# Altium footprint library STguitar.PcbLib: 33 footprints (part 2 of 3)
Each footprint in its own frame and in the unit in brackets; x right, y up, seen from the top. Pads: shape width x height; smd on the part's side, far side on the other; paste and mask are expansions set on the pad; w line width, h text height; cw(c..) or ccw(c..) is an arc to the next point about the centre after c.
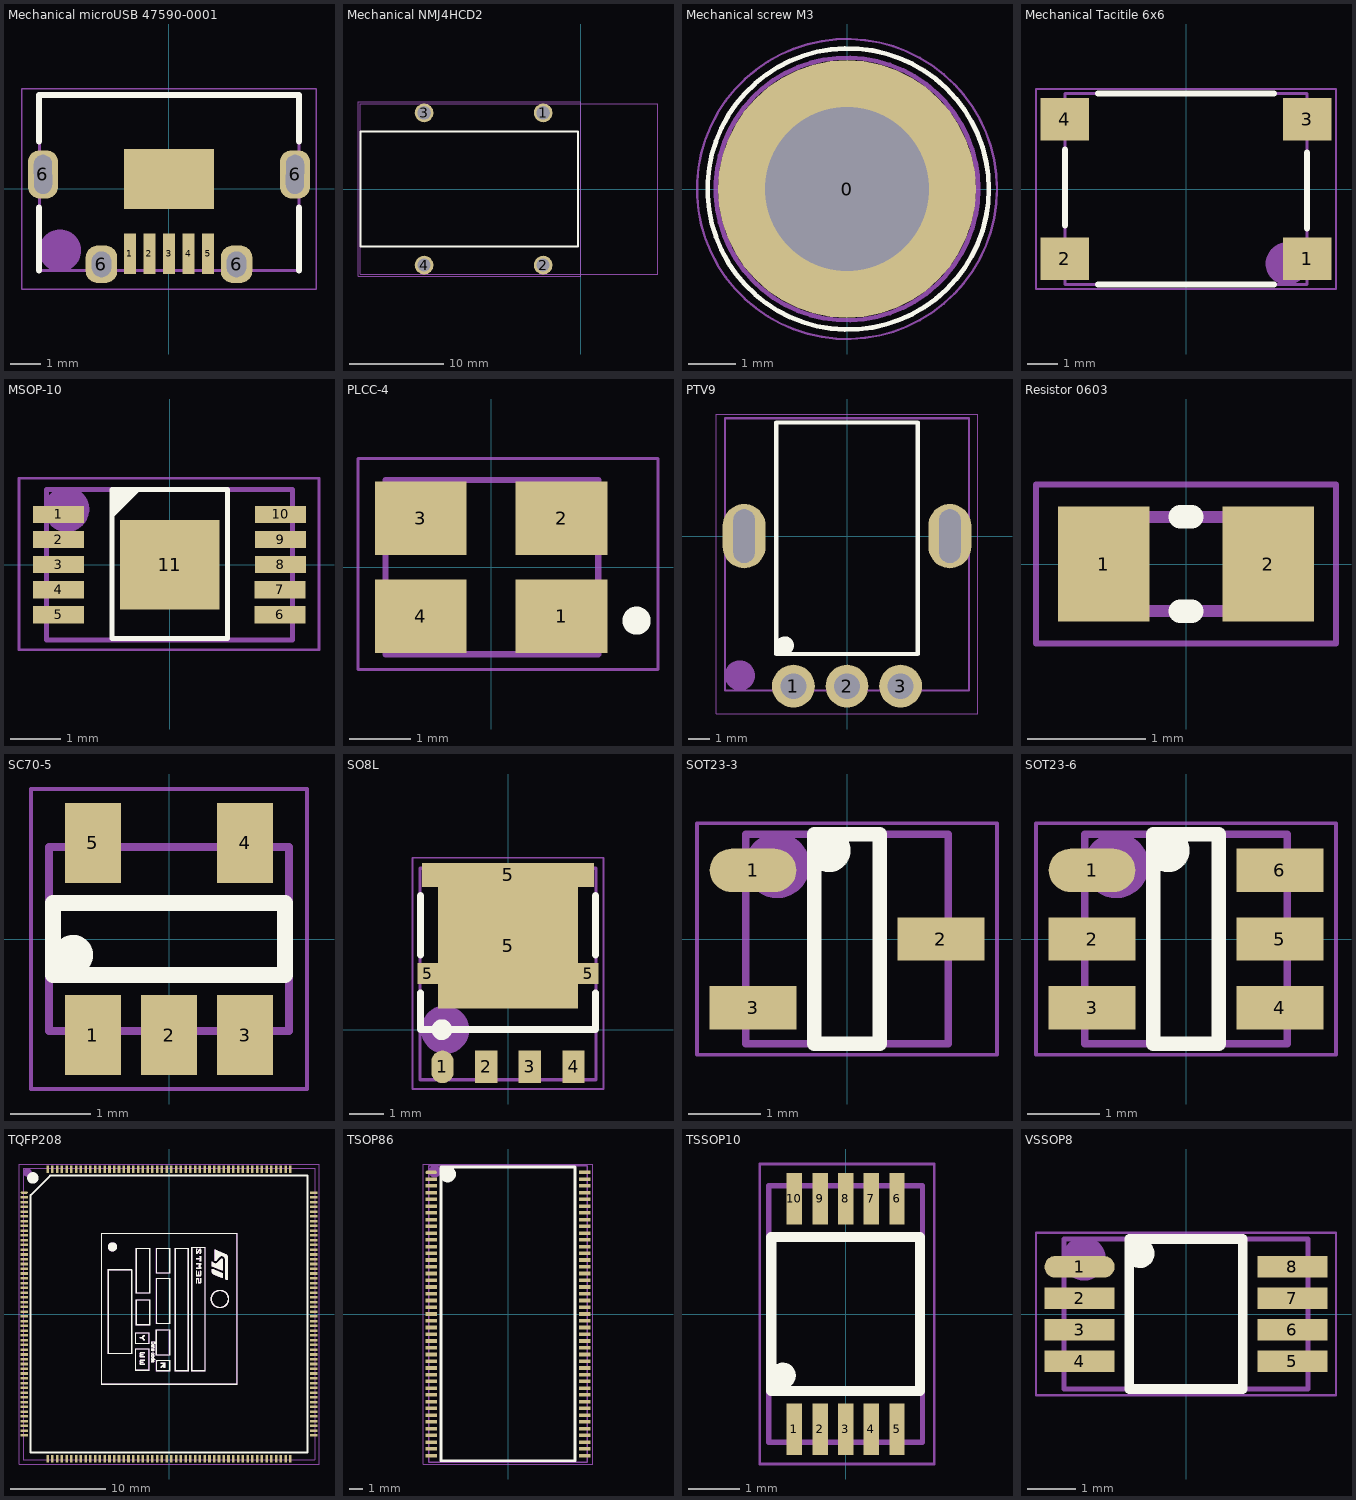
[diagram p1: the footprints below, top view; thin cyan lines are the x and y axes]

## Mechanical microUSB 47590-0001 [mm]
pads (10):
  rect 0.4x1.35 smd: 1(-1.3,-2.166) 2(-0.65,-2.166) 3(0,-2.166) 4(0.65,-2.166) 5(1.3,-2.166)
  rrect75% 1x1.6 hole 1.3 slot 0.6 at 0.33 deg: 6(-4.2,0.484)
  rrect75% 1.05x1.25 hole 0.85 slot 0.65 at 0.33 deg: 6(-2.25,-2.516)
  rrect75% 1.05x1.25 hole 0.85 slot 0.65 at 179.67 deg: 6(2.25,-2.516)
  rrect75% 1x1.6 hole 1.3 slot 0.6 at 179.67 deg: 6(4.2,0.484)
  rect 3x2 smd: ""(0,0.334)
Top Overlay:
  lines w0.2: -4.325,-2.716 -4.325,-0.616 ; -4.325,1.584 -4.325,3.134 -0.925,3.134 4.325,3.134 4.325,1.584 ; 4.325,-2.716 4.325,-0.616
Mechanical 13:
  lines w0.1: -4.325,-2.716 4.325,-2.716 4.325,3.184 -4.325,3.184 -4.325,-2.716
  lines w1: -3.432,-2.057 cw(c-3.632,-2.057) -3.433,-2.036
  text ".Designator" at -3.75,-0.1 h1
Top Component Outline (Mech15):
  lines w0.05: -4.9,-3.341 -4.9,3.334 4.9,3.334 4.9,-3.341 -4.9,-3.341
3D body "475900001.stp": height 2.71, standoff -0.65, extent -4.325,-2.716 4.325,3.184

## Mechanical NMJ4HCD2 [mm]
pads (4):
  round 2 hole 1.4: 1(-4,8.115) 2(-4,-8.115) 3(-16.7,8.115) 4(-16.7,-8.115)
Top Overlay:
  lines w0.2: -23.473,-6.115 -23.473,6.115 -0.3,6.115 -0.3,-6.115 -23.473,-6.115
Mechanical 13:
  lines w0.1: -23.525,-9.1 -23.525,9.1 8.25,9.1 8.25,-9.1 -23.525,-9.1
  text ".Designator" at -22.325,-0.7 h2
Top Component Outline (Mech15):
  lines w0.05: -23.75,-9.325 0,-9.325 0,9.325 -23.75,9.325 -23.75,-9.325
3D body "User Library-Audio Jack Neutrik Amphenol 6_35.STEP": height 17.8, standoff -2.14, extent -23.53,-9.1 8.264,9.1

## Mechanical screw M3 [mm]
pads (1):
  round 5.5 hole 3.5: 0(0,0)
Top Overlay:
  circle w0.1: c0.025,0 r3
Mechanical 13:
  circle w0.1: c0,0 r2.8
  text ".Designator" at 0,0 h0.5
Top Component Outline (Mech15):
  circle w0.05: c0,0 r3.2
3D body "TR Fastenings Ltd-M3X5MM.step": height 3, standoff -5, extent -2.75,-2.75 2.75,2.75

## Mechanical Tacitile 6x6 [mm]
pads (4):
  rect 1.6x1.4 smd: 1(4,-2.3) 2(-4,-2.3) 3(4,2.3) 4(-4,2.3)
Top Overlay:
  lines w0.2: -4,-1.2 -4,1.3 ; -2.9,-3.15 2.9,-3.15 ; -2.9,3.15 2.9,3.15 ; 4,-1.3 4,1.2
Mechanical 13:
  lines w0.1: -4,-3.15 -4,3.15 4,3.15 4,-3.15 -4,-3.15
  lines w1: 3.527,-2.464 cw(c3.327,-2.464) 3.526,-2.443
  text ".Designator" at -3.125,-0.175 h0.8
Top Component Outline (Mech15):
  lines w0.05: -4.95,-3.3 -4.95,3.3 4.95,3.3 4.95,-3.3 -4.95,-3.3
3D body "B3FS_1000.step": height 3, standoff -0.1, extent -4,-3.15 4,3.15

## MSOP-10 [mm]
pads (11):
  rect 1.016x0.343 smd: 1(-2.212,1) 2(-2.212,0.5) 3(-2.212,0) 4(-2.212,-0.5) 5(-2.212,-1) 6(2.2,-1) 7(2.2,-0.5) 8(2.212,0) 9(2.212,0.5) 10(2.212,1)
  rect 1.982x1.782 smd: 11(0,0)
Top Overlay:
  lines w0.1: -1.15,0.975 -0.625,1.5 ; -1.15,1.075 -0.725,1.5 ; -1.125,1.175 -0.8,1.5 -0.775,1.5 ; -1.125,1.3 -0.925,1.5 ; -1.125,1.375 -1,1.5 ; -1.15,-1.475 -1.15,1.5 1.15,1.5 1.15,-1.475 -1.15,-1.475
Mechanical 13:
  lines w0.1: -2.45,-1.5 -2.45,1.5 2.45,1.5 2.45,-1.5 -2.45,-1.5
  lines w0.5: -1.851,1.121 ccw(c-2.05,1.1) -1.85,1.1
  text ".Designator" at -2.275,-0.275 h0.5
Top Component Outline (Mech15):
  lines w0.05: -3,-1.7 2.975,-1.7 2.975,1.725 -3,1.725 -3,-1.7
3D body "User Library-MSOP-10-1.step": height 1.05, standoff 0, extent -2.514,-1.5 2.514,1.5

## PLCC-4 [mm]
pads (4):
  rect 1.5x1.2 smd: 1(1.15,-0.8) 2(1.15,0.8) 3(-1.15,0.8) 4(-1.15,-0.8)
Top Overlay:
  circle w0.254: c2.375,-0.875 r0.103
Mechanical 13:
  lines w0.1: -1.725,-1.425 1.75,-1.425 1.75,1.425 -1.725,1.425 -1.725,-1.425
  lines w0.5: 1.05,-0.9 cw(c1.05,-0.8) 1.06,-0.899
  text ".Designator" at -1.2,-0.45 h1
Top Component Outline (Mech15):
  lines w0.05: -2.175,-1.675 2.725,-1.675 2.725,1.775 -2.175,1.775 -2.175,-1.675
3D body "User Library-HSMx-A2_A3-xx-xxxxx SMD LED PLCC-4.step": height 1.9, standoff 0, extent -1.75,-1.4 1.75,1.4

## PTV9 [mm]
pads (5):
  round 2 hole 1.2: 1(-2.5,-7) 2(0,-7) 3(2.5,-7)
  oval 2x3 hole 2.5 slot 1 at 0 deg: ""(-4.8,0) ""(4.8,0)
Top Overlay:
  circle w0.45: c-2.9,-5.1 r0.2
  lines w0.2: -3.3,-5.5 3.3,-5.5 3.3,5.3 -3.3,5.3 -3.3,-5.5
Mechanical 13:
  lines w0.1: -5.7,-7.2 5.7,-7.2 5.7,5.5 -5.7,5.5 -5.7,-7.2
  lines w1: -4.8,-6.5 cw(c-5,-6.5) -4.801,-6.479
  text ".Designator" at -2.85,-0.025 h1
Top Component Outline (Mech15):
  lines w0.05: -6.1,-8.3 6.1,-8.3 6.1,5.7 -6.1,5.7 -6.1,-8.3
3D body "ptv09a-4x15f-xxxx.stp": height 14.5, standoff -4.49, extent -5.7,-7.15 5.7,5.5

## Resistor 0603 [mm]
pads (2):
  rect 0.78x0.98 smd: 1(-0.7,0) 2(0.7,0)
Top Overlay:
  lines w0.2: -0.05,-0.4 0.05,-0.4 ; -0.05,0.4 0.05,0.4
Mechanical 13:
  lines w0.1: -0.8,-0.4 -0.8,0.4 0.8,0.4 0.8,-0.4 -0.8,-0.4
  text ".Designator" at -0.8,-0.225 h0.5
Top Component Outline (Mech15):
  lines w0.05: -1.275,-0.675 -1.275,0.675 1.275,0.675 1.275,-0.675 -1.275,-0.675
3D body "User Library-SMD RESISTOR-1 (1).step": height 0.43, standoff -0.03, extent -0.85,-0.4 0.75,0.4

## SC70-5 [mm]
pads (5):
  rect 0.7x1 smd: 1(-0.95,-1.2) 2(0,-1.2) 3(0.95,-1.2) 4(0.95,1.2) 5(-0.95,1.2)
Top Overlay:
  circle w0.254: c-1.2,-0.2 r0.125
  lines w0.2: -1.45,-0.45 1.45,-0.45 1.45,0.45 -1.45,0.45 -1.45,-0.45
Mechanical 13:
  lines w0.1: -1.5,-1.15 1.5,-1.15 1.5,1.15 -1.5,1.15 -1.5,-1.15
  text ".Designator" at -0.8,-0.225 h0.5
Top Component Outline (Mech15):
  lines w0.05: -1.725,-1.875 1.725,-1.875 1.725,1.875 -1.725,1.875 -1.725,-1.875
3D body "User Library-sot353.step": height 1, standoff 0, extent -1.05,-1.15 1.05,1.15

## SO8L [mm]
pads (8):
  oval 0.65x0.95 smd: 1(-1.905,-1.081)
  rect 0.65x0.95 smd: 2(-0.635,-1.081) 3(0.635,-1.081) 4(1.905,-1.081)
  rect 0.595x0.61 smd: 5(-2.328,1.634) 5(2.328,1.634)
  rect 4.061x3.63 smd: 5(0,2.435)
  rect 5x0.7 smd: 5(0,4.5)
Top Overlay:
  circle w0.3: c-1.925,0 r0.15
  lines w0.2: -2.55,1.075 -2.55,0 2.55,0 2.55,1.075 ; -2.55,2.175 -2.55,3.9 ; 2.55,2.175 2.55,3.9
Mechanical 13:
  lines w0.1: -2.56,-1.455 2.56,-1.455 2.56,4.695 -2.56,4.695 -2.56,-1.455
  lines w1: -1.629,0 cw(c-1.829,0) -1.63,0.021
  text ".Designator" at 0.3,-1 h0.7
Top Component Outline (Mech15):
  lines w0.05: -2.775,-1.725 2.775,-1.725 2.775,5 -2.775,5 -2.775,-1.725
3D body "User Library-PowerPAK_SO-8L_SINGLE.STEP": height 1.07, standoff 0, extent -2.56,-1.455 2.56,4.695

## SOT23-3 [mm] "SOT23, 3-Leads, Body 2.9x1.3mm, Pitch 0.95mm, Lead Span 2.5mm, IPC High Density"
height 1.1
pads (3):
  oval 1.2x0.6 smd: 1(-1.3,0.95)
  rect 1.2x0.6 smd: 2(1.3,0) 3(-1.3,-0.95)
Top Overlay:
  circle w0.3: c-0.25,1.225 r0.15
  lines w0.2: -0.45,-1.45 0.45,-1.45 0.45,1.45 -0.45,1.45 -0.45,-1.45
Mechanical 13:
  lines w0.1: -1.4,-1.45 1.4,-1.45 1.4,1.45 -1.4,1.45 -1.4,-1.45
  lines w0.5: -0.765,1.016 cw(c-0.965,1.016) -0.766,1.037
  text ".Designator" at -1.075,-0.1 h0.5
Top Component Outline (Mech15):
  lines w0.05: -2.075,-1.6 2.075,-1.6 2.075,1.6 -2.075,1.6 -2.075,-1.6
3D body "CircuitWorks-SOT-23.step": height 1.06, standoff -0.04, extent -1.25,-1.5 1.25,1.5

## SOT23-6 [mm]
pads (6):
  oval 1.2x0.6 smd: 1(-1.3,0.95)
  rect 1.2x0.6 smd: 2(-1.3,0) 3(-1.3,-0.95) 4(1.3,-0.95) 5(1.3,0) 6(1.3,0.95)
Top Overlay:
  circle w0.3: c-0.25,1.225 r0.15
  lines w0.2: -0.45,-1.45 0.45,-1.45 0.45,1.45 -0.45,1.45 -0.45,-1.45
Mechanical 13:
  lines w0.1: -1.4,-1.45 1.4,-1.45 1.4,1.45 -1.4,1.45 -1.4,-1.45
  lines w0.5: -0.765,1.016 cw(c-0.965,1.016) -0.766,1.037
  text ".Designator" at -1.225,-0.175 h0.5
Top Component Outline (Mech15):
  lines w0.05: -2.075,-1.6 2.075,-1.6 2.075,1.6 -2.075,1.6 -2.075,-1.6
3D body "SN74LVC2G14DBVR.stp": height 1.45, standoff 0, extent -1.4,-1.45 1.4,1.45

## TQFP208 [mm]
pads (208):
  oval 0.75x0.27 smd: 1(-15.2,12.75)
  rect 0.75x0.27 smd: 2(-15.2,12.25) 3(-15.2,11.75) 4(-15.2,11.25) 5(-15.2,10.75) 6(-15.2,10.25) 7(-15.2,9.75) 8(-15.2,9.25) 9(-15.2,8.75) 10(-15.2,8.25) 11(-15.2,7.75) 12(-15.2,7.25) 13(-15.2,6.75) 14(-15.2,6.25) 15(-15.2,5.75) 16(-15.2,5.25) 17(-15.2,4.75) 18(-15.2,4.25) 19(-15.2,3.75) 20(-15.2,3.25) 21(-15.2,2.75) 22(-15.2,2.25) 23(-15.2,1.75) 24(-15.2,1.25) 25(-15.2,0.75) 26(-15.2,0.25) 27(-15.2,-0.25) 28(-15.2,-0.75) 29(-15.2,-1.25) 30(-15.2,-1.75) 31(-15.2,-2.25) 32(-15.2,-2.75) 33(-15.2,-3.25) 34(-15.2,-3.75) 35(-15.2,-4.25) 36(-15.2,-4.75) 37(-15.2,-5.25) 38(-15.2,-5.75) 39(-15.2,-6.25) 40(-15.2,-6.75) 41(-15.2,-7.25) 42(-15.2,-7.75) 43(-15.2,-8.25) 44(-15.2,-8.75) 45(-15.2,-9.25) 46(-15.2,-9.75) 47(-15.2,-10.25) 48(-15.2,-10.75) 49(-15.2,-11.25) 50(-15.2,-11.75) 51(-15.2,-12.25) 52(-15.2,-12.75) 105(15.2,-12.75) 106(15.2,-12.25) 107(15.2,-11.75) 108(15.2,-11.25) 109(15.2,-10.75) 110(15.2,-10.25) 111(15.2,-9.75) 112(15.2,-9.25) 113(15.2,-8.75) 114(15.2,-8.25) 115(15.2,-7.75) 116(15.2,-7.25) 117(15.2,-6.75) 118(15.2,-6.25) 119(15.2,-5.75) 120(15.2,-5.25) 121(15.2,-4.75) 122(15.2,-4.25) 123(15.2,-3.75) 124(15.2,-3.25) 125(15.2,-2.75) 126(15.2,-2.25) 127(15.2,-1.75) 128(15.2,-1.25) 129(15.2,-0.75) 130(15.2,-0.25) 131(15.2,0.25) 132(15.2,0.75) 133(15.2,1.25) 134(15.2,1.75) 135(15.2,2.25) 136(15.2,2.75) 137(15.2,3.25) 138(15.2,3.75) 139(15.2,4.25) 140(15.2,4.75) 141(15.2,5.25) 142(15.2,5.75) 143(15.2,6.25) 144(15.2,6.75) 145(15.2,7.25) 146(15.2,7.75) 147(15.2,8.25) 148(15.2,8.75) 149(15.2,9.25) 150(15.2,9.75) 151(15.2,10.25) 152(15.2,10.75) 153(15.2,11.25) 154(15.2,11.75) 155(15.2,12.25) 156(15.2,12.75)
  rect 0.27x0.75 smd: 53(-12.75,-15.2) 54(-12.25,-15.2) 55(-11.75,-15.2) 56(-11.25,-15.2) 57(-10.75,-15.2) 58(-10.25,-15.2) 59(-9.75,-15.2) 60(-9.25,-15.2) 61(-8.75,-15.2) 62(-8.25,-15.2) 63(-7.75,-15.2) 64(-7.25,-15.2) 65(-6.75,-15.2) 66(-6.25,-15.2) 67(-5.75,-15.2) 68(-5.25,-15.2) 69(-4.75,-15.2) 70(-4.25,-15.2) 71(-3.75,-15.2) 72(-3.25,-15.2) 73(-2.75,-15.2) 74(-2.25,-15.2) 75(-1.75,-15.2) 76(-1.25,-15.2) 77(-0.75,-15.2) 78(-0.25,-15.2) 79(0.25,-15.2) 80(0.75,-15.2) 81(1.25,-15.2) 82(1.75,-15.2) 83(2.25,-15.2) 84(2.75,-15.2) 85(3.25,-15.2) 86(3.75,-15.2) 87(4.25,-15.2) 88(4.75,-15.2) 89(5.25,-15.2) 90(5.75,-15.2) 91(6.25,-15.2) 92(6.75,-15.2) 93(7.25,-15.2) 94(7.75,-15.2) 95(8.25,-15.2) 96(8.75,-15.2) 97(9.25,-15.2) 98(9.75,-15.2) 99(10.25,-15.2) 100(10.75,-15.2) 101(11.25,-15.2) 102(11.75,-15.2) 103(12.25,-15.2) 104(12.75,-15.2) 157(12.75,15.2) 158(12.25,15.2) 159(11.75,15.2) 160(11.25,15.2) 161(10.75,15.2) 162(10.25,15.2) 163(9.75,15.2) 164(9.25,15.2) 165(8.75,15.2) 166(8.25,15.2) 167(7.75,15.2) 168(7.25,15.2) 169(6.75,15.2) 170(6.25,15.2) 171(5.75,15.2) 172(5.25,15.2) 173(4.75,15.2) 174(4.25,15.2) 175(3.75,15.2) 176(3.25,15.2) 177(2.75,15.2) 178(2.25,15.2) 179(1.75,15.2) 180(1.25,15.2) 181(0.75,15.2) 182(0.25,15.2) 183(-0.25,15.2) 184(-0.75,15.2) 185(-1.25,15.2) 186(-1.75,15.2) 187(-2.25,15.2) 188(-2.75,15.2) 189(-3.25,15.2) 190(-3.75,15.2) 191(-4.25,15.2) 192(-4.75,15.2) 193(-5.25,15.2) 194(-5.75,15.2) 195(-6.25,15.2) 196(-6.75,15.2) 197(-7.25,15.2) 198(-7.75,15.2) 199(-8.25,15.2) 200(-8.75,15.2) 201(-9.25,15.2) 202(-9.75,15.2) 203(-10.25,15.2) 204(-10.75,15.2) 205(-11.25,15.2) 206(-11.75,15.2) 207(-12.25,15.2) 208(-12.75,15.2)
Top Overlay:
  drawing of 3154 lines, arcs and shapes, not listed
Mechanical 13:
  drawing of 3153 lines, arcs and shapes, not listed
  text ".Designator" at -9.55,9.906 h2
Top Component Outline (Mech15):
  lines w0.05: -15.75,-15.75 15.75,-15.75 15.75,15.75 -15.75,15.75 -15.75,-15.75
3D body "User Library-TQFP-208-1.step": height 3.5, standoff 0, extent -15.293,-15.293 15.293,15.293

## TSOP86 [mm]
pads (86):
  oval 0.835x0.27 smd: 1(-5.7,10.5)
  rect 0.835x0.27 smd: 2(-5.7,10) 3(-5.7,9.5) 4(-5.7,9) 5(-5.7,8.5) 6(-5.7,8) 7(-5.7,7.5) 8(-5.7,7) 9(-5.7,6.5) 10(-5.7,6) 11(-5.7,5.5) 12(-5.7,5) 13(-5.7,4.5) 14(-5.7,4) 15(-5.7,3.5) 16(-5.7,3) 17(-5.7,2.5) 18(-5.7,2) 19(-5.7,1.5) 20(-5.7,1) 21(-5.7,0.5) 22(-5.7,0) 23(-5.7,-0.5) 24(-5.7,-1) 25(-5.7,-1.5) 26(-5.7,-2) 27(-5.7,-2.5) 28(-5.7,-3) 29(-5.7,-3.5) 30(-5.7,-4) 31(-5.7,-4.5) 32(-5.7,-5) 33(-5.7,-5.5) 34(-5.7,-6) 35(-5.7,-6.5) 36(-5.7,-7) 37(-5.7,-7.5) 38(-5.7,-8) 39(-5.7,-8.5) 40(-5.7,-9) 41(-5.7,-9.5) 42(-5.7,-10) 43(-5.7,-10.5) 44(5.7,-10.5) 45(5.7,-10) 46(5.7,-9.5) 47(5.7,-9) 48(5.7,-8.5) 49(5.7,-8) 50(5.7,-7.5) 51(5.7,-7) 52(5.7,-6.5) 53(5.7,-6) 54(5.7,-5.5) 55(5.7,-5) 56(5.7,-4.5) 57(5.7,-4) 58(5.7,-3.5) 59(5.7,-3) 60(5.7,-2.5) 61(5.7,-2) 62(5.7,-1.5) 63(5.7,-1) 64(5.7,-0.5) 65(5.7,0) 66(5.7,0.5) 67(5.7,1) 68(5.7,1.5) 69(5.7,2) 70(5.7,2.5) 71(5.7,3) 72(5.7,3.5) 73(5.7,4) 74(5.7,4.5) 75(5.7,5) 76(5.7,5.5) 77(5.7,6) 78(5.7,6.5) 79(5.7,7) 80(5.7,7.5) 81(5.7,8) 82(5.7,8.5) 83(5.7,9) 84(5.7,9.5) 85(5.7,10) 86(5.7,10.5)
Top Overlay:
  circle w0.6: c-4.468,10.368 r0.3
  lines w0.2: -4.975,-10.875 -4.975,10.9 -0.013,10.9 4.975,10.9 4.975,-10.875 -4.975,-10.875
Mechanical 13:
  lines w0.1: -5.895,-10.994 -5.895,11 5.895,11 5.895,-10.994 -5.895,-10.994
  lines w0.5: -5.236,10.566 cw(c-5.436,10.566) -5.237,10.587
  text ".Designator" at 0.125,-2.875 h1
Top Component Outline (Mech15):
  lines w0.05: -6.3,-11.125 6.3,-11.125 6.3,11.125 -6.3,11.125 -6.3,-11.125
3D body "User Library-TSOP-86.STEP": height 1.06, standoff -0.03, extent -5.895,-10.994 5.895,11

## TSSOP10 [mm]
pads (10):
  rect 0.3x1 smd: 1(-1,-2.25) 2(-0.5,-2.25) 3(0,-2.25) 4(0.5,-2.25) 5(1,-2.25) 6(1,2.25) 7(0.5,2.25) 8(0,2.25) 9(-0.5,2.25) 10(-1,2.25)
Top Overlay:
  circle w0.254: c-1.225,-1.2 r0.125
  lines w0.2: -1.45,-1.5 -1.45,1.5 1.45,1.5 1.45,-1.5 -1.45,-1.5
Mechanical 13:
  lines w0.1: -1.5,-2.5 -1.5,2.5 1.5,2.5 1.5,-2.5 -1.5,-2.5
  text ".Designator" at -0.8,-0.225 h0.5
Top Component Outline (Mech15):
  lines w0.05: -1.675,-2.925 -1.675,2.925 1.725,2.925 1.725,-2.925 -1.675,-2.925
3D body "User Library-TSSOP-10.step": height 1.1, standoff 0, extent -1.5,-2.5 1.5,2.5

## VSSOP8 [mm]
pads (8):
  oval 1.45x0.45 smd: 1(-2.2,0.975)
  rect 1.45x0.45 smd: 2(-2.2,0.325) 3(-2.2,-0.325) 4(-2.2,-0.975) 5(2.2,-0.975) 6(2.2,-0.325) 7(2.2,0.325) 8(2.2,0.975)
Top Overlay:
  circle w0.3: c-0.95,1.25 r0.15
  lines w0.2: -1.175,-1.55 1.175,-1.55 1.175,1.55 -1.175,1.55 -1.175,-1.55
Mechanical 13:
  lines w0.1: -2.522,-1.55 2.522,-1.55 2.522,1.55 -2.522,1.55 -2.522,-1.55
  lines w0.5: -1.908,1.143 cw(c-2.108,1.143) -1.909,1.164
  text ".Designator" at -2.15,-0.125 h0.5
Top Component Outline (Mech15):
  lines w0.05: -3.1,-1.675 3.1,-1.675 3.1,1.675 -3.1,1.675 -3.1,-1.675
3D body "User Library-SOP50P310X110-8N[VSSOP_DGK_MO-187AA].step": height 1.15, standoff 0, extent -2.522,-1.55 2.522,1.55